# Altium footprint library ACTION_IC.PcbLib: 135 footprints (part 9 of 9)
Each footprint in its own frame and in the unit in brackets; x right, y up, seen from the top. Pads: shape width x height; smd on the part's side, far side on the other; paste and mask are expansions set on the pad; w line width, h text height; cw(c..) or ccw(c..) is an arc to the next point about the centre after c.
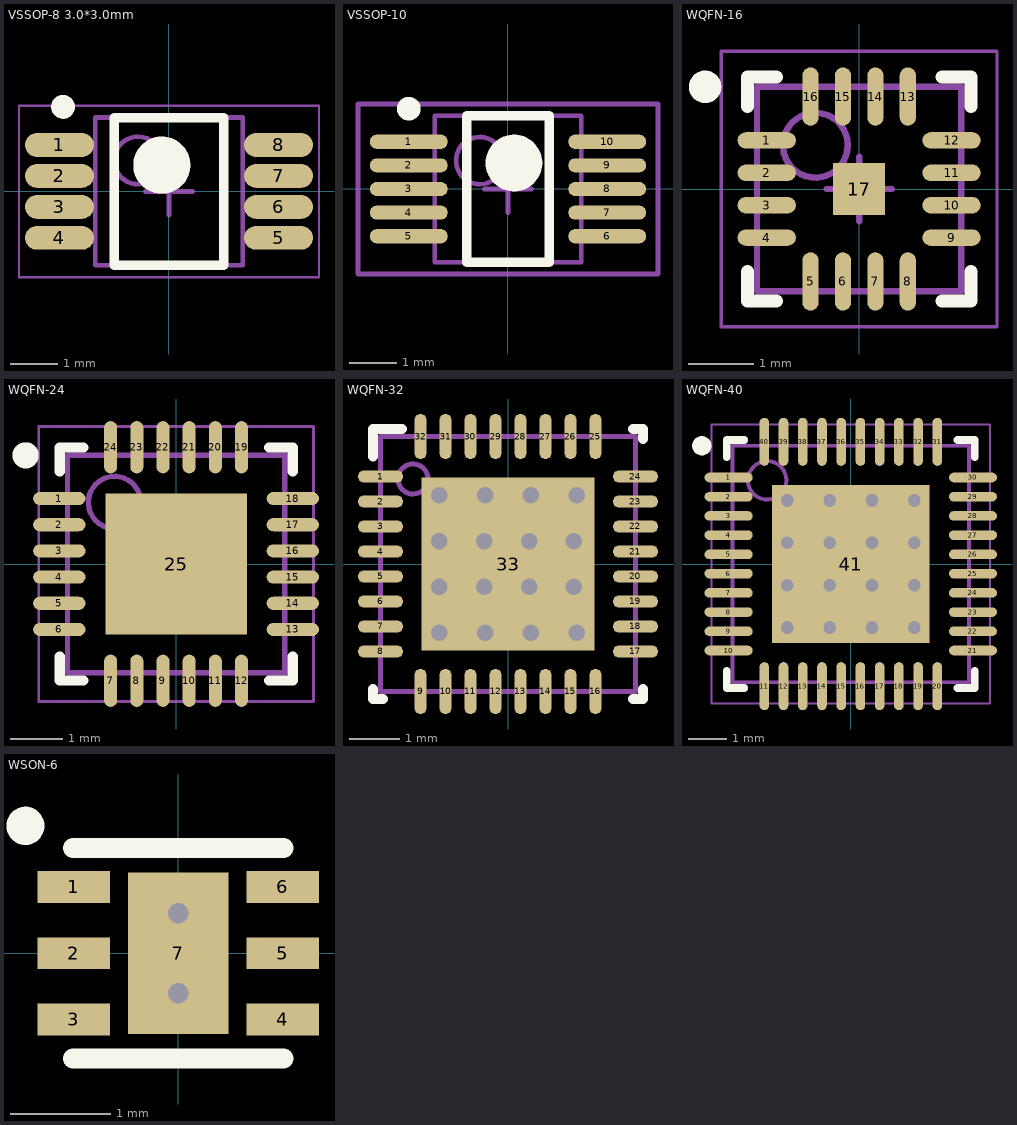
[diagram p8: the footprints below, top view; thin cyan lines are the x and y axes]

## VSSOP-8 3.0*3.0mm [mm]
height 1.1
pads (8):
  oval 1.45x0.5 smd: 1(-2.301,0.975) 2(-2.301,0.325) 3(-2.301,-0.325) 4(-2.301,-0.975) 5(2.301,-0.975) 6(2.301,-0.325) 7(2.301,0.325) 8(2.301,0.975)
Top Overlay:
  circle w0.6: c-0.15,0.55 r0.3
  circle w0.25: c-2.225,1.775 r0.125
  lines w0.2: -1.15,-1.55 1.15,-1.55 1.15,1.55 -1.15,1.55 -1.15,-1.55
Mechanical 13:
  circle w0.1: c-0.65,0.65 r0.5
  lines w0.1: -1.55,-1.55 1.55,-1.55 1.55,1.55 -1.55,1.55 -1.55,-1.55
Mechanical 15:
  lines w0.05: -3.15,-1.8 3.15,-1.8 3.15,1.8 -3.15,1.8 -3.15,-1.8
  lines w0.1: -0.5,0 0.5,0 ; 0,-0.5 0,0.5
3D body: height 1.1, standoff 0.25, extent -1.55,-1.55 1.55,1.55

## VSSOP-10 [mm]
height 1.1
pads (10):
  oval 1.65x0.3 smd: 1(-2.1,1) 2(-2.1,0.5) 3(-2.1,0) 4(-2.1,-0.5) 5(-2.1,-1) 6(2.1,-1) 7(2.1,-0.5) 8(2.1,0) 9(2.1,0.5) 10(2.1,1)
Top Overlay:
  circle w0.6: c0.125,0.55 r0.3
  circle w0.25: c-2.1,1.7 r0.125
  lines w0.2: -0.875,-1.55 0.875,-1.55 0.875,1.55 -0.875,1.55 -0.875,-1.55
Mechanical 13:
  circle w0.1: c-0.6,0.6 r0.5
  lines w0.1: -1.55,-1.55 1.55,-1.55 1.55,1.55 -1.55,1.55 -1.55,-1.55
Mechanical 15:
  lines w0.1: -0.5,0 0.5,0 ; 0,-0.5 0,0.5 ; -3.175,-1.8 3.175,-1.8 3.175,1.8 -3.175,1.8 -3.175,-1.8
3D body: height 1.1, standoff 0.1, extent -1.55,-1.55 1.55,1.55

## WQFN-16 [mm]
height 0.8
pads (17):
  oval 0.9x0.25 smd: 1(-1.425,0.75) 2(-1.425,0.25) 3(-1.425,-0.25) 4(-1.425,-0.75) 9(1.425,-0.75) 10(1.425,-0.25) 11(1.425,0.25) 12(1.425,0.75)
  oval 0.25x0.9 smd: 5(-0.75,-1.425) 6(-0.25,-1.425) 7(0.25,-1.425) 8(0.75,-1.425) 13(0.75,1.425) 14(0.25,1.425) 15(-0.25,1.425) 16(-0.75,1.425)
  rect 0.8x0.8 smd: 17(0,0)
Top Overlay:
  circle w0.25: c-2.375,1.575 r0.125
  lines w0.2: -1.725,-1.275 -1.725,-1.725 -1.275,-1.725 ; -1.725,1.275 -1.725,1.725 -1.275,1.725 ; 1.275,-1.725 1.725,-1.725 1.725,-1.275 ; 1.275,1.725 1.725,1.725 1.725,1.275
Mechanical 13:
  circle w0.1: c-0.675,0.675 r0.5
  lines w0.1: -1.575,-1.575 -1.575,1.575 1.575,1.575 1.575,-1.575 -1.575,-1.575
Mechanical 15:
  lines w0.05: -2.125,-2.125 -2.125,2.125 2.125,2.125 2.125,-2.125 -2.125,-2.125
  lines w0.1: -0.5,0 0.5,0 ; 0,-0.5 0,0.5
3D body: height 0.8, standoff 0.05, extent -1.575,-1.575 1.575,1.575

## WQFN-24 [mm] "QFN, 24-Leads, Body 4.00x4.00mm, Pitch 0.50mm, Thermal Pad 2.70x2.70mm, IPC Medium Density"
height 0.8
pads (25):
  oval 1x0.25 smd: 1(-2.229,1.25) 2(-2.229,0.75) 3(-2.229,0.25) 4(-2.229,-0.25) 5(-2.229,-0.75) 6(-2.229,-1.25) 13(2.229,-1.25) 14(2.229,-0.75) 15(2.229,-0.25) 16(2.229,0.25) 17(2.229,0.75) 18(2.229,1.25)
  oval 0.25x1 smd: 7(-1.25,-2.229) 8(-0.75,-2.229) 9(-0.25,-2.229) 10(0.25,-2.229) 11(0.75,-2.229) 12(1.25,-2.229) 19(1.25,2.229) 20(0.75,2.229) 21(0.25,2.229) 22(-0.25,2.229) 23(-0.75,2.229) 24(-1.25,2.229)
  rect 2.7x2.7 smd: 25(0,0)
Top Overlay:
  circle w0.25: c-2.875,2.075 r0.125
  lines w0.2: -2.225,-1.775 -2.225,-2.225 -1.775,-2.225 ; -2.225,1.775 -2.225,2.225 -1.775,2.225 ; 1.775,-2.225 2.225,-2.225 2.225,-1.775 ; 1.775,2.225 2.225,2.225 2.225,1.775
Mechanical 13:
  circle w0.1: c-1.175,1.175 r0.5
  lines w0.1: -2.075,-2.075 -2.075,2.075 2.075,2.075 2.075,-2.075 -2.075,-2.075
Mechanical 15:
  lines w0.05: -2.625,-2.625 -2.625,2.625 2.625,2.625 2.625,-2.625 -2.625,-2.625
  lines w0.1: -0.5,0 0.5,0 ; 0,-0.5 0,0.5
3D body: height 0.8, standoff 0.01, extent -2.075,-2.075 2.075,2.075

## WQFN-32 [mm]
pads (33):
  oval 0.9x0.24 smd paste+0 mask+0.051: 1(-2.55,1.75) 2(-2.55,1.25) 3(-2.55,0.75) 4(-2.55,0.25) 5(-2.55,-0.25) 6(-2.55,-0.75) 7(-2.55,-1.25) 8(-2.55,-1.75) 17(2.55,-1.75) 18(2.55,-1.25) 19(2.55,-0.75) 20(2.55,-0.25) 21(2.55,0.25) 22(2.55,0.75) 23(2.55,1.25) 24(2.55,1.75)
  oval 0.24x0.9 smd paste+0 mask+0.051: 9(-1.75,-2.55) 10(-1.25,-2.55) 11(-0.75,-2.55) 12(-0.25,-2.55) 13(0.25,-2.55) 14(0.75,-2.55) 15(1.25,-2.55) 16(1.75,-2.55) 25(1.75,2.55) 26(1.25,2.55) 27(0.75,2.55) 28(0.25,2.55) 29(-0.25,2.55) 30(-0.75,2.55) 31(-1.25,2.55) 32(-1.75,2.55)
  rect 3.45x3.45 smd paste-1.712 mask+0.051: 33(0,0)
via 1.371,-1.371 diameter 0.66 hole 0.33
via 0.457,-1.371 diameter 0.66 hole 0.33
via -0.457,-1.371 diameter 0.66 hole 0.33
via -1.371,-1.371 diameter 0.66 hole 0.33
via 1.32,-0.457 diameter 0.66 hole 0.33
via 0.423,-0.457 diameter 0.66 hole 0.33
via -0.474,-0.457 diameter 0.66 hole 0.33
via -1.371,-0.457 diameter 0.66 hole 0.33
via 1.32,0.457 diameter 0.66 hole 0.33
via 0.423,0.457 diameter 0.66 hole 0.33
via -0.474,0.457 diameter 0.66 hole 0.33
via -1.371,0.457 diameter 0.66 hole 0.33
via 1.371,1.371 diameter 0.66 hole 0.33
via 0.457,1.371 diameter 0.66 hole 0.33
via -0.457,1.371 diameter 0.66 hole 0.33
via -1.371,1.371 diameter 0.66 hole 0.33
Top Overlay:
  lines w0.2: -2.7,-2.5 -2.7,-2.7 -2.5,-2.7 ; -2.7,2.15 -2.7,2.7 -2.125,2.7 ; 2.5,-2.7 2.7,-2.7 2.7,-2.5 ; 2.5,2.7 2.7,2.7 2.7,2.5
Top Paste:
  region: 0.1,1.586 0.1,0.1 1.586,0.1 1.586,1.586
  region: -0.1,0.1 -0.1,1.586 -1.586,1.586 -1.586,0.1
  region: -0.1,-1.586 -0.1,-0.1 -1.586,-0.1 -1.586,-1.586
  region: 0.1,-0.1 0.1,-1.586 1.586,-1.586 1.586,-0.1
Mechanical 13:
  circle w0.1: c-1.9,1.7 r0.3
  lines w0.1: -2.55,-2.55 -2.55,2.55 2.55,2.55 2.55,-2.55 -2.55,-2.55
3D body: height 0.8, standoff 0, extent -2.54,-2.54 2.54,2.54

## WQFN-40 [mm]
height 1
pads (41):
  oval 1.25x0.25 smd: 1(-3.178,2.25) 2(-3.178,1.75) 3(-3.178,1.25) 4(-3.178,0.75) 5(-3.178,0.25) 6(-3.178,-0.25) 7(-3.178,-0.75) 8(-3.178,-1.25) 9(-3.178,-1.75) 10(-3.178,-2.25) 21(3.178,-2.25) 22(3.178,-1.75) 23(3.178,-1.25) 24(3.178,-0.75) 25(3.178,-0.25) 26(3.178,0.25) 27(3.178,0.75) 28(3.178,1.25) 29(3.178,1.75) 30(3.178,2.25)
  oval 0.25x1.25 smd: 11(-2.25,-3.178) 12(-1.75,-3.178) 13(-1.25,-3.178) 14(-0.75,-3.178) 15(-0.25,-3.178) 16(0.25,-3.178) 17(0.75,-3.178) 18(1.25,-3.178) 19(1.75,-3.178) 20(2.25,-3.178) 31(2.25,3.178) 32(1.75,3.178) 33(1.25,3.178) 34(0.75,3.178) 35(0.25,3.178) 36(-0.25,3.178) 37(-0.75,3.178) 38(-1.25,3.178) 39(-1.75,3.178) 40(-2.25,3.178)
  rect 4.1x4.1 smd: 41(0,0)
via 1.65,-1.65 diameter 0.66 hole 0.33
via 0.55,-1.65 diameter 0.66 hole 0.33
via -0.55,-1.65 diameter 0.66 hole 0.33
via -1.65,-1.65 diameter 0.66 hole 0.33
via 1.65,-0.55 diameter 0.66 hole 0.33
via 0.55,-0.55 diameter 0.66 hole 0.33
via -0.55,-0.55 diameter 0.66 hole 0.33
via -1.65,-0.55 diameter 0.66 hole 0.33
via 1.65,0.55 diameter 0.66 hole 0.33
via 0.55,0.55 diameter 0.66 hole 0.33
via -0.55,0.55 diameter 0.66 hole 0.33
via -1.65,0.55 diameter 0.66 hole 0.33
via 1.65,1.65 diameter 0.66 hole 0.33
via 0.55,1.65 diameter 0.66 hole 0.33
via -0.55,1.65 diameter 0.66 hole 0.33
via -1.65,1.65 diameter 0.66 hole 0.33
Top Overlay:
  circle w0.25: c-3.875,3.075 r0.125
  lines w0.2: -3.225,-2.775 -3.225,-3.225 -2.775,-3.225 ; -3.225,2.775 -3.225,3.225 -2.775,3.225 ; 2.775,-3.225 3.225,-3.225 3.225,-2.775 ; 2.775,3.225 3.225,3.225 3.225,2.775
Mechanical 13:
  circle w0.1: c-2.175,2.175 r0.5
  lines w0.1: -3.075,-3.075 3.075,-3.075 3.075,3.075 -3.075,3.075 -3.075,-3.075
Mechanical 15:
  lines w0.05: -3.625,-3.625 3.625,-3.625 3.625,3.625 -3.625,3.625 -3.625,-3.625
  lines w0.1: -0.5,0 0.5,0 ; 0,-0.5 0,0.5
3D body "WQFN-40.step": height 1, standoff 0, extent -3.125,-3.125 3.125,3.125

## WSON-6 [mil]
pads (7):
  rect 28.5x12.5 smd: 1(-41,26) 2(-41,0) 3(-41,-26) 4(41,-26) 5(41,0) 6(41,26)
  rect 39.5x63.5 smd: 7(0,0)
via 0,-15.7 diameter 19.7 hole 7.9
via 0,15.7 diameter 19.7 hole 7.9
Top Overlay:
  circle w10: c-60,50 r2.5
  lines w7.9: -41.3,-41.34 41.34,-41.34 ; -41.3,41.34 41.34,41.34